# Altium footprint library Connector.PcbLib: 230 footprints (part 5 of 15)
Each footprint in its own frame and in the unit in brackets; x right, y up, seen from the top. Pads: shape width x height; smd on the part's side, far side on the other; paste and mask are expansions set on the pad; w line width, h text height; cw(c..) or ccw(c..) is an arc to the next point about the centre after c.
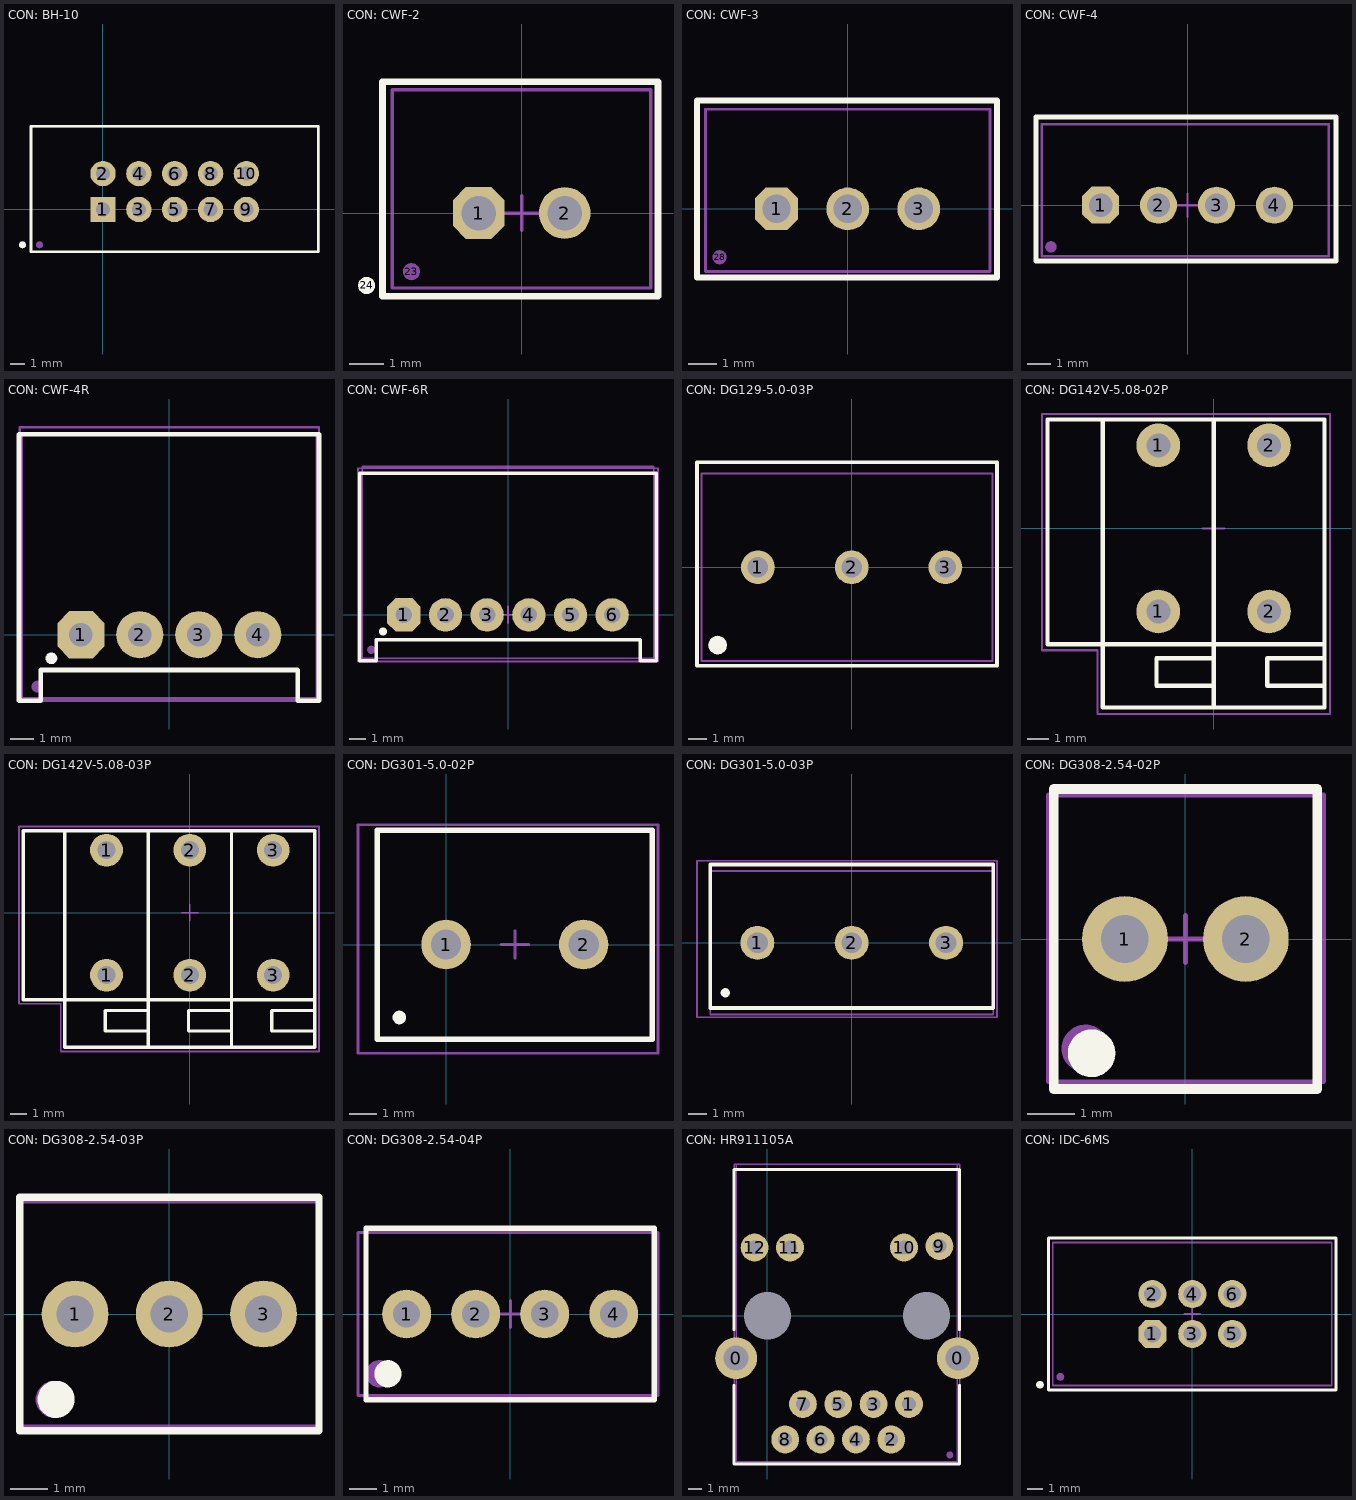
[diagram p4: the footprints below, top view; thin cyan lines are the x and y axes]

## CON: BH-10 [mm] "Connector; Header; 10 Position"
pads (12):
  rect 1.8x1.8 hole 1: 1(0,0)
  round 1.8 hole 1: 2(0,2.54) 3(2.54,0) 4(2.54,2.54) 5(5.08,0) 6(5.08,2.54) 7(7.62,0) 8(7.62,2.54) 9(10.16,0) 10(10.16,2.54)
  round 0.5 on Top Overlay: ""(-5.7,-2.5)
  round 0.5 on Mech1: ""(-4.5,-2.5)
Top Overlay:
  lines w0.2: -5.1,-3 15.25,-3 15.25,5.9 -5.1,5.9 -5.1,-3
TopAssy:
  lines w0.1: -5.07,-2.98 -5.07,5.87 15.23,5.87 15.23,-2.98 -5.07,-2.98
Border:
  lines w0.1: -5.1,-3 -5.1,5.9 15.3,5.9 15.3,-3 -5.1,-3
3D body "User Library-IDC Socket Male 10pin Straight THT Goldplated 2_54mm.STEP": height 2.77, standoff -9.63, extent -5.07,-2.98 15.23,5.87

## CON: CWF-2 [mm]
height 7.7
pads (4):
  oct 1.5x1.5 hole 1: 1(-1.25,0)
  round 1.5 hole 1: 2(1.25,0)
  round 0.5 on Mech1: 23(-3.2,-1.7)
  round 0.5 on Top Overlay: 24(-4.5,-2.1)
Top Overlay:
  lines w0.2: -4.044,-2.413 -4.044,3.81 3.957,3.81 3.957,-2.413 -4.044,-2.413
TopAssy:
  lines w0.1: -3.75,-2.175 3.75,-2.175 3.75,3.575 -3.75,3.575 -3.75,-2.175
Border:
  lines w0.1: -0.5,0 0.5,0 ; 0,-0.5 0,0.5 ; -4.044,-2.413 3.957,-2.413 3.957,3.81 -4.044,3.81 -4.044,-2.413
3D body "CWF-2.step": height 7, standoff -3.5, extent -3.75,-2.175 3.75,3.575

## CON: CWF-3 [mm]
height 7.7
pads (4):
  oct 1.5x1.5 hole 1: 1(-2.5,0)
  round 1.5 hole 1: 2(0,0) 3(2.5,0)
  round 0.5 on Mech1: 28(-4.5,-1.7)
Top Overlay:
  lines w0.2: -5.294,-2.413 -5.294,3.81 5.247,3.81 5.247,-2.413 -5.294,-2.413
TopAssy:
  lines w0.1: -5,-2.2 5,-2.2 5,3.5 -5,3.5 -5,-2.2
Border:
  lines w0.1: -0.5,0 0.5,0 ; 0,-0.5 0,0.5 ; -5.294,-2.413 5.247,-2.413 5.247,3.81 -5.294,3.81 -5.294,-2.413
3D body "CWF-3.step": height 7, standoff -3.5, extent -5,-2.2 5,3.55

## CON: CWF-4 [mm]
height 7.7
pads (5):
  oct 1.6x1.6 hole 1: 1(-3.75,0)
  round 1.6 hole 1: 2(-1.25,0) 3(1.25,0) 4(3.75,0)
  round 0.5 on Mech1: ""(-5.9,-1.8)
Top Overlay:
  lines w0.2: -6.544,-2.413 6.41,-2.413 6.41,3.81 -6.544,3.81 -6.544,-2.413
TopAssy:
  lines w0.1: -6.3,-2.2 -6.3,3.5 6.1,3.5 6.1,-2.2 -6.3,-2.2
Border:
  lines w0.1: -0.5,0 0.5,0 ; 0,-0.5 0,0.5 ; -6.544,-2.413 -6.544,3.81 6.41,3.81 6.41,-2.413 -6.544,-2.413
3D body "CWF-4.step": height 7, standoff -3.5, extent -6.267,-2.194 6.133,3.556

## CON: CWF-4R [mm]
pads (6):
  oct 2x2 hole 1: 1(-3.75,0)
  round 2 hole 1: 2(-1.25,0) 3(1.25,0) 4(3.75,0)
  round 0.5 on Mech1: ""(-5.6,-2.2)
  round 0.5 on Top Overlay: ""(-5,-1)
Top Overlay:
  lines w0.2: -6.375,-2.8 -6.375,8.5 6.35,8.5 6.35,-2.8 5.45,-2.8 5.45,-1.5 -5.45,-1.5 -5.45,-2.8 -6.375,-2.8
TopAssy:
  lines w0.1: -6.25,-2.7 -6.25,8.5 6.25,8.5 6.25,-2.7 -6.25,-2.7
Border:
  lines w0.1: -6.35,-2.8 6.35,-2.8 6.35,8.8 -6.35,8.8 -6.35,-2.8
3D body "12.STEP": height 5.75, standoff -3.5, extent -6.25,-2.7 6.25,8.8

## CON: CWF-6R [mm]
pads (8):
  oct 2x2 hole 1: 1(-6.25,0)
  round 2 hole 1: 2(-3.75,0) 3(-1.25,0) 4(1.25,0) 5(3.75,0) 6(6.25,0)
  round 0.5 on Mech1: ""(-8.2,-2.1)
  round 0.5 on Top Overlay: ""(-7.5,-1)
Top Overlay:
  lines w0.2: -8.9,-2.75 -8.9,8.5 8.9,8.5 8.9,-2.75 7.925,-2.75 7.925,-1.5 -7.9,-1.5 -7.9,-2.75 -8.9,-2.75
TopAssy:
  lines w0.1: -8.75,-2.6 8.75,-2.6 8.75,8.9 -8.75,8.9 -8.75,-2.6
Border:
  lines w0.1: -0.5,0 0.5,0 ; 0,-0.5 0,0.5 ; -9,-2.8 9,-2.8 9,8.8 -9,8.8 -9,-2.8
3D body "User Library-DS1069-6 CWF-6R.STEP": height 5.75, standoff -3.5, extent -8.75,-2.6 8.75,8.9

## CON: DG129-5.0-03P [mm]
pads (4):
  round 1.8 hole 1.1: 1(-5,0) 2(0,0) 3(5,0)
  round 1 on Top Overlay: ""(-7.15,-4.15)
Top Overlay:
  lines w0.2: -8.25,-5.25 -8.25,5.6 7.75,5.6 7.75,-5.25 -8.25,-5.25
TopAssy:
  lines w0.1: -8,-5 -8,5 7.5,5 7.5,-5 -8,-5
Border:
  lines w0.1: -0.5,0 0.5,0 ; 0,-0.5 0,0.5 ; -8.25,-5.25 -8.25,5.6 7.75,5.6 7.75,-5.25 -8.25,-5.25
3D body "User Library-DG129-5_0-2.STEP": height 19.05, standoff -3.9, extent -8,-5 2.5,5
3D body "User Library-DG129-5_0-2.STEP": height 19.05, standoff -3.9, extent -3,-5 7.5,5

## CON: DG142V-5.08-02P [mm]
height 14.1
pads (4):
  round 2 hole 1.1: 1(-2.54,-3.81) 1(-2.54,3.81) 2(2.54,-3.81) 2(2.54,3.81)
Top Overlay:
  lines w0.2: -5.08,4.99 -5.08,-8.21 5.08,-8.21 5.08,4.99 -7.62,4.99 -7.62,-5.31 5.08,-5.31 ; 0,-8.21 0,4.99 ; 0,-7.21 -2.62,-7.21 -2.62,-5.96 0,-5.96 ; 5.08,-7.21 2.46,-7.21 2.46,-5.96 5.08,-5.96
TopAssy:
  lines w0.1: -5.08,4.99 -5.08,-8.21 5.08,-8.21 5.08,4.99 -7.62,4.99 -7.62,-5.31 5.08,-5.31 ; 0,-8.21 0,4.99 ; 0,-7.21 -2.62,-7.21 -2.62,-5.96 0,-5.96 ; 5.08,-7.21 2.46,-7.21 2.46,-5.96 5.08,-5.96
Border:
  lines w0.1: -0.5,0 0.5,0 ; 0,-0.5 0,0.5 ; -7.874,-5.588 -7.874,5.244 5.334,5.244 5.334,-8.509 -2.413,-8.509 -5.334,-8.509 -5.334,-5.588 -7.874,-5.588
3D body "DG142V-5.08-02P.STEP": height 14.2, standoff 0, extent -7.62,-8.209 5.14,4.99

## CON: DG142V-5.08-03P [mm]
height 14.1
pads (6):
  round 2 hole 1.1: 1(-5.08,-3.81) 1(-5.08,3.81) 2(0,-3.81) 2(0,3.81) 3(5.08,-3.81) 3(5.08,3.81)
Top Overlay:
  lines w0.2: -7.62,4.99 -7.62,-8.21 7.62,-8.21 7.62,4.99 -10.16,4.99 -10.16,-5.31 7.62,-5.31 ; -2.54,-8.21 -2.54,4.99 ; -2.54,-7.21 -5.16,-7.21 -5.16,-5.96 -2.54,-5.96 ; 2.54,-8.21 2.54,4.99 ; 2.54,-7.21 -0.08,-7.21 -0.08,-5.96 2.54,-5.96 ; 7.62,-7.21 5,-7.21 5,-5.96 7.62,-5.96
TopAssy:
  lines w0.1: -7.62,4.99 -7.62,-8.21 7.62,-8.21 7.62,4.99 -10.16,4.99 -10.16,-5.31 7.62,-5.31 ; -2.54,-8.21 -2.54,4.99 ; -2.54,-7.21 -5.16,-7.21 -5.16,-5.96 -2.54,-5.96 ; 2.54,-8.21 2.54,4.99 ; 2.54,-7.21 -0.08,-7.21 -0.08,-5.96 2.54,-5.96 ; 7.62,-7.21 5,-7.21 5,-5.96 7.62,-5.96
Border:
  lines w0.1: -0.5,0 0.5,0 ; 0,-0.5 0,0.5 ; -10.414,-5.543 -7.874,-5.543 -7.874,-8.464 7.874,-8.464 7.874,5.252 -10.414,5.252 -10.414,-5.543
3D body "DG142V-5.08-03P.STEP": height 14.2, standoff 0, extent -10.16,-8.209 7.68,4.99

## CON: DG301-5.0-02P [mm]
pads (3):
  round 1.8 hole 1.1: 1(0,0) 2(5,0)
  round 0.5 on Top Overlay: ""(-1.7,-2.65)
Top Overlay:
  lines w0.2: -2.5,-3.45 -2.5,4.15 7.5,4.15 7.5,-3.45 -2.5,-3.45
TopAssy:
  lines w0.1: -2.5,-3.45 -2.5,4.15 7.5,4.15 7.5,-3.45 -2.5,-3.45
Border:
  lines w0.1: 2,0 3,0 ; 2.5,-0.5 2.5,0.5 ; -3.2,-3.95 -3.2,4.35 7.7,4.35 7.7,-3.95 -3.2,-3.95
3D body "User Library-DG301-5_0-2P12.STEP": height 10, standoff -4.16, extent -3.1,-3.4 7.5,4.2

## CON: DG301-5.0-03P [mm]
pads (4):
  round 1.8 hole 1.1: 1(-5,0) 2(0,0) 3(5,0)
  round 0.5 on Top Overlay: ""(-6.7,-2.65)
Top Overlay:
  lines w0.2: -7.5,-3.45 -7.5,4.15 7.5,4.15 7.5,-3.45 -7.5,-3.45
TopAssy:
  lines w0.1: -7.5,-3.8 -7.5,3.8 7.5,3.8 7.5,-3.8 -7.5,-3.8
Border:
  lines w0.1: -0.5,0 0.5,0 ; 0,-0.5 0,0.5 ; -8.2,-3.95 -8.2,4.35 7.7,4.35 7.7,-3.95 -8.2,-3.95
3D body "User Library-DG301-5_0-3P12.STEP": height 10, standoff -4.16, extent -8.1,-3.45 7.5,4.15

## CON: DG308-2.54-02P [mm]
height 8.5
pads (2):
  round 1.8 hole 1: 1(-1.27,0) 2(1.27,0)
Top Overlay:
  circle w0.5: c-1.97,-2.4 r0.25
  lines w0.2: -2.765,-3.15 2.765,-3.15 2.765,3.15 -2.765,3.15 -2.765,-3.15
TopAssy:
  circle w0.5: c-2.1,-2.3 r0.25
  lines w0.1: -2.875,-3 2.9,-3 2.9,3.025 -2.875,3.025 -2.875,-3
Border:
  lines w0.1: -0.5,0 0.5,0 ; 0,-0.5 0,0.5 ; -2.775,-3.15 2.775,-3.15 2.775,3.15 -2.775,3.15 -2.775,-3.15
3D body "User Library-DG308-2.STEP": height 7.83, standoff -4, extent -2.9,-3 2.9,3.022

## CON: DG308-2.54-03P [mm]
height 8.5
pads (3):
  round 1.8 hole 1: 1(-2.54,0) 2(0,0) 3(2.54,0)
Top Overlay:
  circle w0.5: c-3.05,-2.3 r0.25
  lines w0.2: -4.035,-3.15 -4.035,3.15 4.035,3.15 4.035,-3.15 -4.035,-3.15
TopAssy:
  circle w0.5: c-3.1,-2.3 r0.25
  lines w0.1: -4,-3.025 4,-3.025 4,3.025 -4,3.025 -4,-3.025
Border:
  lines w0.1: -0.5,0 0.5,0 ; 0,-0.5 0,0.5 ; -4.05,-3.15 4.025,-3.15 4.025,3.15 -4.05,3.15 -4.05,-3.15
3D body "User Library-DG308-3.STEP": height 7.83, standoff -4, extent -4,-3.011 4,3.011

## CON: DG308-2.54-04P [mm]
height 8.5
pads (4):
  round 1.8 hole 1: 1(-3.81,0) 2(-1.27,0) 3(1.27,0) 4(3.81,0)
Top Overlay:
  circle w0.5: c-4.5,-2.2 r0.25
  lines w0.2: -5.305,-3.15 -5.305,3.15 5.305,3.15 5.305,-3.15 -5.305,-3.15
TopAssy:
  circle w0.5: c-4.81,-2.2 r0.25
  lines w0.1: -5.6,-3 5.44,-3 5.44,3 -5.6,3 -5.6,-3
Border:
  lines w0.1: -0.49,0 0.51,0 ; 0.01,-0.5 0.01,0.5 ; -5.3,-3.05 5.3,-3.05 5.3,3.125 -5.3,3.125 -5.3,-3.05
3D body "User Library-DG308-4.STEP": height 7.83, standoff -4, extent -5.575,-3.011 5.425,3.011

## CON: HR911105A [mm]
height 14
pads (17):
  round 3 hole 1.8: 0(-2.25,-3.05) 0(13.68,-3.05)
  oval 0.7x0 hole 3.4: 0(0,0) 0(11.43,0)
  round 2 hole 1: 1(10.165,-6.35) 2(8.895,-8.89) 3(7.625,-6.35) 4(6.355,-8.89) 5(5.085,-6.35) 6(3.815,-8.89) 7(2.545,-6.35) 8(1.275,-8.89) 9(12.35,5) 10(9.81,4.9) 11(1.62,4.9) 12(-0.92,4.9)
  round 0.5 on Mech1: ""(13.1,-10)
Top Overlay:
  lines w0.2: -2.4,-5 -2.4,-10.65 13.8,-10.65 13.8,-5 ; -2.4,-1 -2.4,10.5 13.8,10.5 13.8,-1
TopAssy:
  lines w0.1: -2.24,-10.5 -2.24,10.9 13.64,10.9 13.64,-10.5 -2.24,-10.5
Border:
  lines w0.1: -2.4,-10.6 13.8,-10.6 13.8,10.9 -2.4,10.9 -2.4,-1 -2.4,-10.6
3D body "User Library-HR911105A.STEP": height 13.6, standoff -2.9, extent -2.24,-10.5 13.64,10.9

## CON: IDC-6MS [mm] "IDC-6MS 6 pin PCB-mount connector"
height 10
pads (8):
  oct 1.8x1.8 hole 1.1: 1(-2.54,-1.27)
  round 1.8 hole 1.1: 2(-2.54,1.27) 3(0,-1.27) 4(0,1.27) 5(2.54,-1.27) 6(2.54,1.27)
  round 0.5 on Mech1: 36(-8.4,-4)
  round 0.5 on Top Overlay: 37(-9.7,-4.5)
Top Overlay:
  lines w0.2: -9.144,-4.826 -9.144,4.826 9.144,4.826 9.144,-4.826 -9.144,-4.826
TopAssy:
  lines w0.1: -8.89,-4.55 8.87,-4.55 8.87,4.55 -8.89,4.55 -8.89,-4.55
Border:
  lines w0.1: -0.5,0 0.5,0 ; 0,-0.5 0,0.5 ; -9.144,-4.826 9.144,-4.826 9.144,4.826 -9.144,4.826 -9.144,-4.826
3D body "IDC-6MS.STEP": height 9, standoff -3, extent -8.89,-4.55 8.87,4.55